# Altium footprint library Cty1.PcbLib: 1378 footprints (part 15 of 87)
Each footprint in its own frame and in the unit in brackets; x right, y up, seen from the top. Pads: shape width x height; smd on the part's side, far side on the other; paste and mask are expansions set on the pad; w line width, h text height; cw(c..) or ccw(c..) is an arc to the next point about the centre after c.
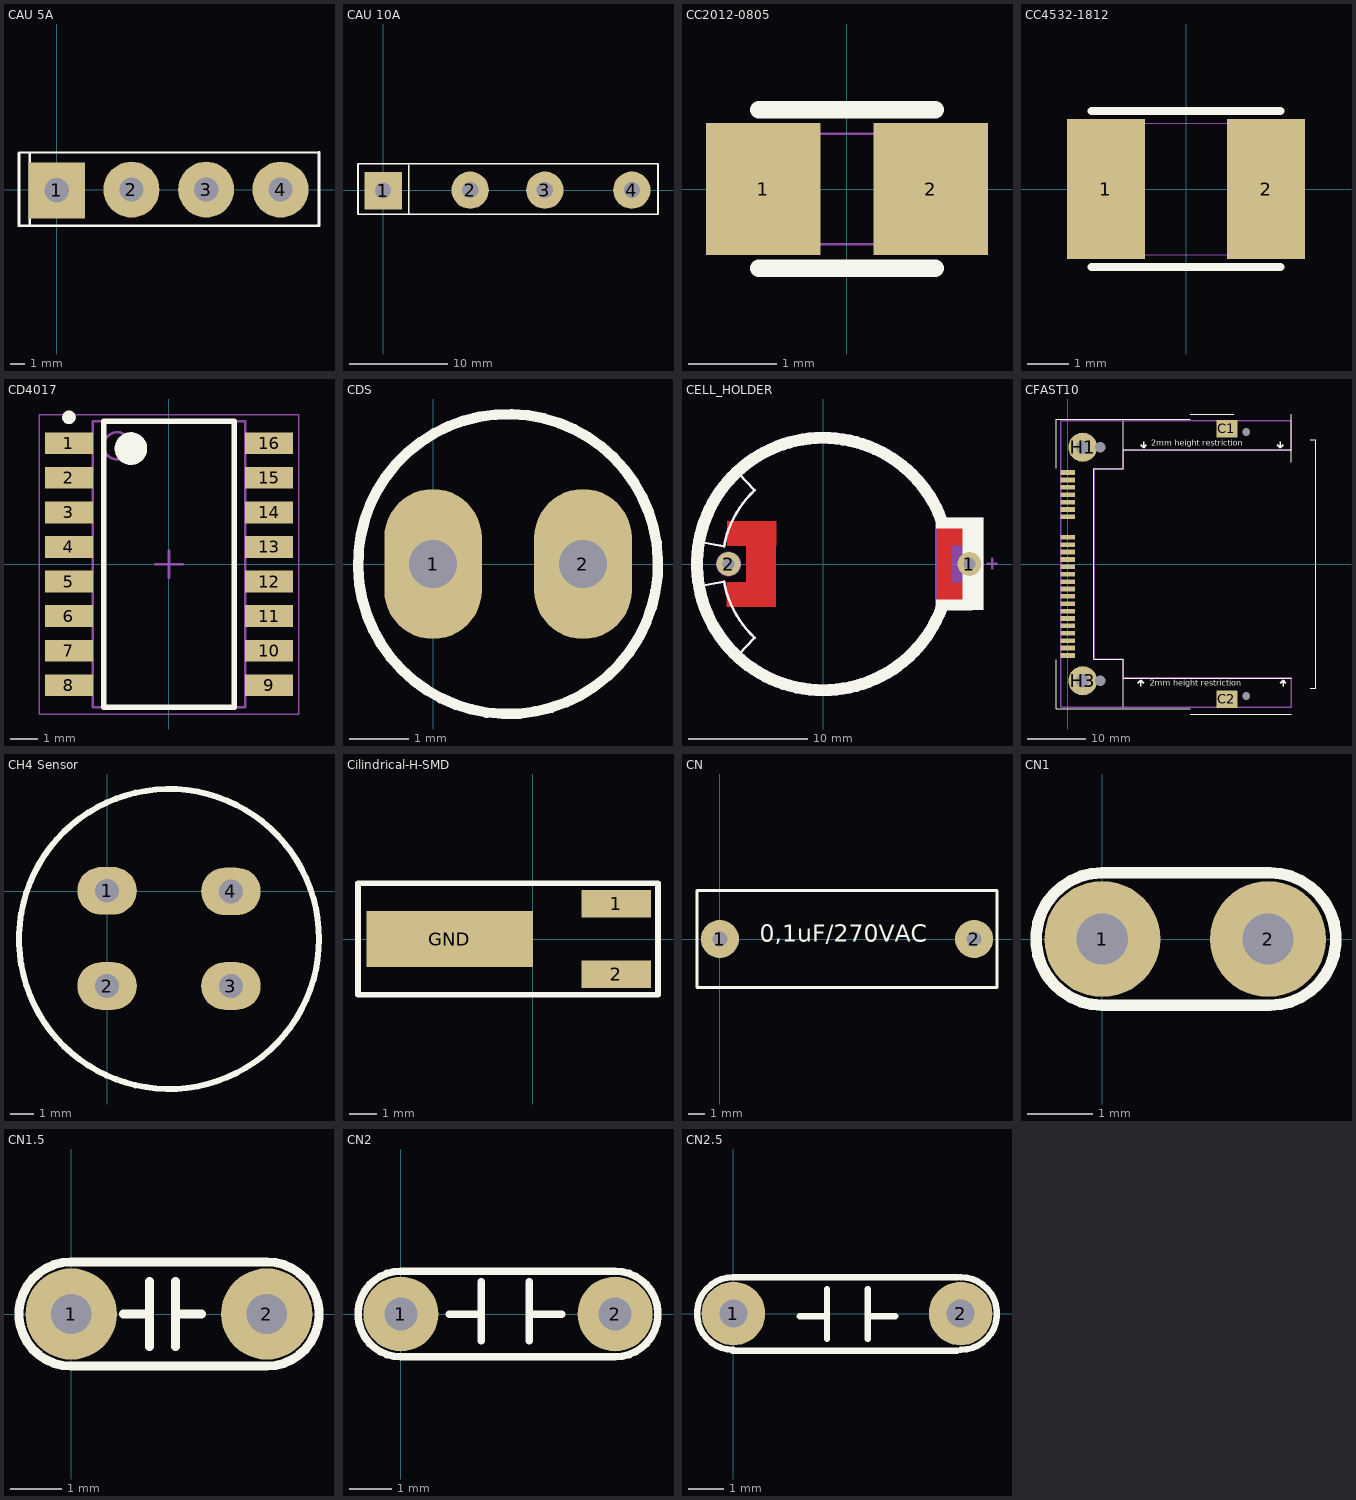
[diagram p14: the footprints below, top view; thin cyan lines are the x and y axes]

## CAU 5A [mil] "CAU 5A DET"
height 800
pads (4):
  rect 150x150 hole 65: 1(0,-2)
  round 150 hole 65: 2(200,0) 3(400,0) 4(599,0)
Top Overlay:
  lines w7: -72,-95 -72,99 ; -101,-97 -101,97 -99,99 702,100 702,-97 -101,-97
3D body "User Library-bridge 2.step": height 820.68, standoff -621.62, extent -138.98,-105 738.98,43.03

## CAU 10A [mil] "CAU 10A det"
height 800
pads (4):
  rect 150x150 hole 65: 1(0,-2)
  round 150 hole 65: 2(350,0) 3(650,0) 4(1000,0)
Top Overlay:
  lines w7: 103,-95 103,99 ; -101,-97 1105,-97 1105,106.36 -101,104.86 -101,-97

## CC2012-0805 [mm]
pads (2):
  rect 1.3x1.5 smd: 1(-0.95,0) 2(0.95,0)
Top Overlay:
  lines w0.2: -1,-0.9 1,-0.9 ; -1,0.9 1,0.9
Mechanical 15:
  lines w0.025: -0.975,-0.625 0.975,-0.625 0.975,0.625 -0.975,0.625 -0.975,-0.625

## CC4532-1812 [mm]
pads (2):
  rect 1.9x3.4 smd: 1(-1.95,0) 2(1.95,0)
Top Overlay:
  lines w0.2: -2.3,-1.9 2.3,-1.9 ; -2.3,1.9 2.3,1.9
Mechanical 15:
  lines w0.025: -2.25,-1.6 -2.25,1.6 2.25,1.6 2.25,-1.6 -2.25,-1.6

## CD4017 [mm] "SOP, 16-Leads, Body 10.50x5.60mm, Pitch 1.27mm, IPC Medium Density"
height 2
pads (16):
  rect 1.75x0.8 smd: 1(-3.675,4.445) 2(-3.675,3.175) 3(-3.675,1.905) 4(-3.675,0.635) 5(-3.675,-0.635) 6(-3.675,-1.905) 7(-3.675,-3.175) 8(-3.675,-4.445) 9(3.675,-4.445) 10(3.675,-3.175) 11(3.675,-1.905) 12(3.675,-0.635) 13(3.675,0.635) 14(3.675,1.905) 15(3.675,3.175) 16(3.675,4.445)
Top Overlay:
  circle w0.25: c-3.675,5.395 r0.125
  circle w0.6: c-1.4,4.25 r0.3
  lines w0.2: -2.4,-5.25 -2.4,5.25 2.4,5.25 2.4,-5.25 -2.4,-5.25
Mechanical 13:
  circle w0.1: c-1.9,4.35 r0.5
  lines w0.1: -2.8,-5.25 -2.8,5.25 2.8,5.25 2.8,-5.25 -2.8,-5.25
Mechanical 15:
  lines w0.05: -4.775,-5.5 -4.775,5.5 4.775,5.5 4.775,-5.5 -4.775,-5.5
  lines w0.1: -0.5,0 0.5,0 ; 0,-0.5 0,0.5
3D body "User Library-SOP16_208mil (5_3mm).STEP": height 2.01, standoff -0.4, extent -3.961,-5.1 4.054,5.1

## CDS [mil] "QUANG TRO"
height 300
pads (2):
  oval 65x100 hole 32: 1(0,0) 2(100,0)
Top Overlay:
  lines w7: 136.62,-49.97 cw(c50,0) 137.42,-48.56

## CELL_HOLDER [mm]
pads (2):
  round 2 hole 1: 1(12.275,0) 2(-7.95,0)
Top Layer:
  rectangle: -6.475,-3.6 -3.95,3.6
  region: -3.941,1.527 -3.941,3.602 -8.09,3.602 -8.09,1.527
  region: -8.109,-1.527 -8.109,-3.602 -3.959,-3.602 -3.959,-1.527
  region: 12.298,1.534 12.298,3.609 9.573,3.609 9.573,1.534
  region: 9.577,-1.534 9.577,-3.609 12.302,-3.609 12.302,-1.534
  region: 10.802,3.591 9.577,3.591 9.577,-3.609 10.802,-3.609
Top Overlay:
  rectangle: 11.716,-3.877 13.466,3.898
  region: 9.466,3.873 9.466,2.998 12.591,2.998 12.591,3.873
  region: 12.59,-3.877 12.59,-3.002 9.466,-3.002 9.466,-3.877
  lines w0.2: -10.325,-1.85 -8.35,-1.5 ; -10.325,1.85 -8.35,1.5 ; -8.325,-1.496 ccw(c0,0) -5.759,-6.195 -7.1,-7.625 ; -8.325,1.496 cw(c0,0) -5.759,6.195 -7.1,7.625 ; 10.4,-3.8 12.5,-3.8 ; 10.425,3.8 12.5,3.8
  lines w1: 9.948,3.661 ccw(c0,0) 9.959,-3.63
Mechanical 7:
  circle w0.4: c-7.95,0 r0.848
  rectangle: 9.398,-3.875 13.475,3.9
  lines w0.2: -10.325,-1.85 -8.35,-1.5 ; -10.325,1.85 -8.35,1.5 ; -8.325,-1.496 ccw(c0,0) -5.759,-6.195 -7.1,-7.625 ; -8.325,1.496 cw(c0,0) -5.759,6.195 -7.1,7.625 ; 13.796,0.026 14.396,0.026 14.596,0.026 ; 14.196,-0.374 14.196,0.426
  lines w1: 9.948,3.661 ccw(c0,0) 9.959,-3.63
3D body: height 0.8, standoff 0.1, extent -8.429,-1.202 -0.041,0.999
3D body: height 0.2, standoff -2.3, extent -8.357,-0.418 -7.518,0.395
3D body: height 0.2, standoff -2.3, extent 11.887,-0.381 12.624,0.381
3D body: height 0.18, standoff 0, extent 10.984,-0.459 12.876,0.49
3D body: height 0.5, standoff 0, extent -10.565,-0.628 10.654,10.59
3D body: height 9, standoff 1, extent 9.725,-3.062 11.187,3.239
3D body: height 10, standoff 0, extent 12.652,-3.687 13.171,3.441
3D body: height 9.9, standoff 0, extent 9.646,-3.974 13.165,3.915
3D body: height 6, standoff 0, extent -10.617,-10.589 10.582,10.629
3D body: height 0.5, standoff 0, extent -10.561,-10.522 10.658,0.696

## CFAST10 [mm]
pads (32):
  rect 3.6x3 smd: C1(27.35,23.3) C2(27.35,-23.3)
  round 5 hole 2.3 mask+0.025: H1(2.55,20.08) H3(2.55,-20.08)
  round 0 hole 1.75 unplated: H2(5.55,20.08) H4(5.55,-20.08)
  round 0 hole 1.35 unplated: H5(30.65,22.7) H6(30.65,-22.7)
  rect 2.5x0.8 smd: PC1(0,4.595) PC2(0,3.325) PC3(0,2.055) PC4(0,0.785) PC5(0,-0.485) PC6(0,-1.755) PC7(0,-3.025) PC8(0,-4.295) PC9(0,-5.565) PC10(0,-6.835) PC11(0,-8.105) PC12(0,-9.375) PC13(0,-10.645) PC14(0,-11.915) PC15(0,-13.185) PC16(0,-14.455) PC17(0,-15.725) S1(0,15.725) S2(0,14.455) S3(0,13.185) S4(0,11.915) S5(0,10.645) S6(0,9.375) S7(0,8.105)
Top Overlay:
  lines w0.2: -2,-16.5 -2,-24.9 21,-24.9 ; -2,16.5 -2,24.9 21,24.9 ; 9.47,-24.6 9.47,-16.4 4.47,-16.4 4.47,16.4 9.47,16.4 9.47,24.6 ; 9.47,-19.615 38.4,-19.615 ; 9.47,19.615 38.4,19.615 ; 21,-25.8 38.4,-25.8 ; 21,25.8 28.5,25.8 ; 38.4,17.5 38.4,25.8 ; 41.7,-21.4 42.6,-21.4 42.6,21.4 41.7,21.4
  lines w0.254: 12,-20.5 12.5,-20 ; 12.5,-21 12.5,-20 ; 12.5,20.5 13,20 ; 13,-20.5 12.5,-20 ; 13,21 13,20 ; 13.5,20.5 13,20 ; 36,20.5 36.5,20 ; 36.5,-20.5 37,-20 ; 36.5,21 36.5,20 ; 37,-21 37,-20 ; 37,20.5 36.5,20 ; 37.5,-20.5 37,-20 ; 36.5,20 36.5,20
  text "2mm height restriction" at 14.3,20.3 h1
  text "2mm height restriction" at 14.1,-20.9 h1
Mechanical 16:
  lines w0.254: -1.2,-24.5 -1.2,24.6 38.4,24.6 38.4,19.6 9.5,19.6 9.5,16.5 9.4,16.4 4.5,16.4 4.5,-16.4 9.5,-16.4 9.5,-19.6 38.4,-19.6 38.4,-24.6 -1.1,-24.6 -1.2,-24.5
Mechanical 29:
  text ".Designator" at 0.9,1 h1.52
3D body "N7G24-AOB2-XX-10-OHT_STP.stp": height 7.69, standoff -0.91, extent -1.03,-24.25 38.2,24.25

## CFAST_LOCKER [mm]
3D body "7E50-C016-00_STP.stp": height 9.7, standoff 1.42, extent -22.415,-19.247 24.815,29.371

## CH4 Sensor [mm]
pads (4):
  oval 2.5x2 hole 1: 1(0,0.025) 2(0,-3.975) 3(5.2,-3.975) 4(5.2,0)
Top Overlay:
  circle w0.254: c2.6,-2 r6.3

## Cilindrical-H-SMD [mm] "Cilindrical canned XTAL, Horizontal, SMD"
height 2
pads (3):
  rect 2.5x1 smd: 1(3,1.27) 2(3,-1.27)
  rect 6x2 smd: GND(-3,0)
Top Overlay:
  lines w0.2: -6.3,-2 4.5,-2 4.5,2 -6.3,2 -6.3,-2
3D body "Cilindrical.STEP": height 2.25, standoff 0.01, extent -5.4,-1.41 3.6,1.41

## CN [mil] "Tu loc 220"
height 100
pads (2):
  round 90 hole 35: 1(0,0) 2(600,0)
Top Overlay:
  lines w7: -54,-115 654,-115 654,115 -54,115 -54,-115
  text "0,1uF/270VAC" at 94,-21 h70
3D body "User Library-223K1600.STEP": height 787.4, standoff -196.85, extent -93.7,-157.48 693.7,157.49

## CN1 [mil]
height 200
pads (2):
  round 70 hole 31: 1(0,0) 2(100,0)
Top Overlay:
  lines w7: 100,-40 0,-40 cw(c0,0) 0,40 100,40 ; 101,-40 ccw(c101,0) 101,40
3D body "User Library-Cap 100n.step": height 265, standoff -46.85, extent -59.93,-30 169.93,36.79

## CN1.5 [mil]
height 200
pads (2):
  round 70 hole 31: 1(0,0) 2(150,0)
Top Overlay:
  lines w7: 40,0 60,0 ; 60,-25 60,25 ; 80,-25 80,25 ; 80,0 100,0 ; 0,-40 cw(c0,0) 0,40 150,40 cw(c150,0) 150,-40 0,-40
3D body "User Library-Ceramic Capacitor 5x3_75mm.STEP": height 254.27, standoff -98.43, extent -21.79,-38.74 171.79,40

## CN2 [mil]
height 200
pads (2):
  round 70 hole 31: 1(0,0) 2(200,0)
Top Overlay:
  lines w7: 45,0 75,0 ; 75,-25 75,30 ; 120,-25 120,30 ; 120,0 150,0 ; 0,-40 cw(c0,0) 0,40 200,40 cw(c200,0) 200,-40 0,-40
3D body "tu hoa 5mm.step": height 407.48, standoff -87.28, extent -54.48,-44.22 260.48,54.6

## CN2.5 [mil] "Tu pin to pin 250mil"
height 200
pads (2):
  round 70 hole 31: 1(0,0) 2(250,0)
Top Overlay:
  lines w7: -1,-41 246,-41 ; 0,-40 cw(c0,0) 0,40 247,40 ; 73,-3 103,-3 ; 103,-28 103,27 ; 148,-28 148,27 ; 148,-3 178,-3 ; 250,-40 ccw(c250,0) 250,40
3D body "User Library-RAD-0_1.STEP": height 248.03, standoff -78.74, extent -32.28,-51.18 278.74,51.18